# Altium integrated library Altium_Library_Brasil.IntLib: 76 symbols
Pins are listed as number, name and electrical type; pins without a type are passive.

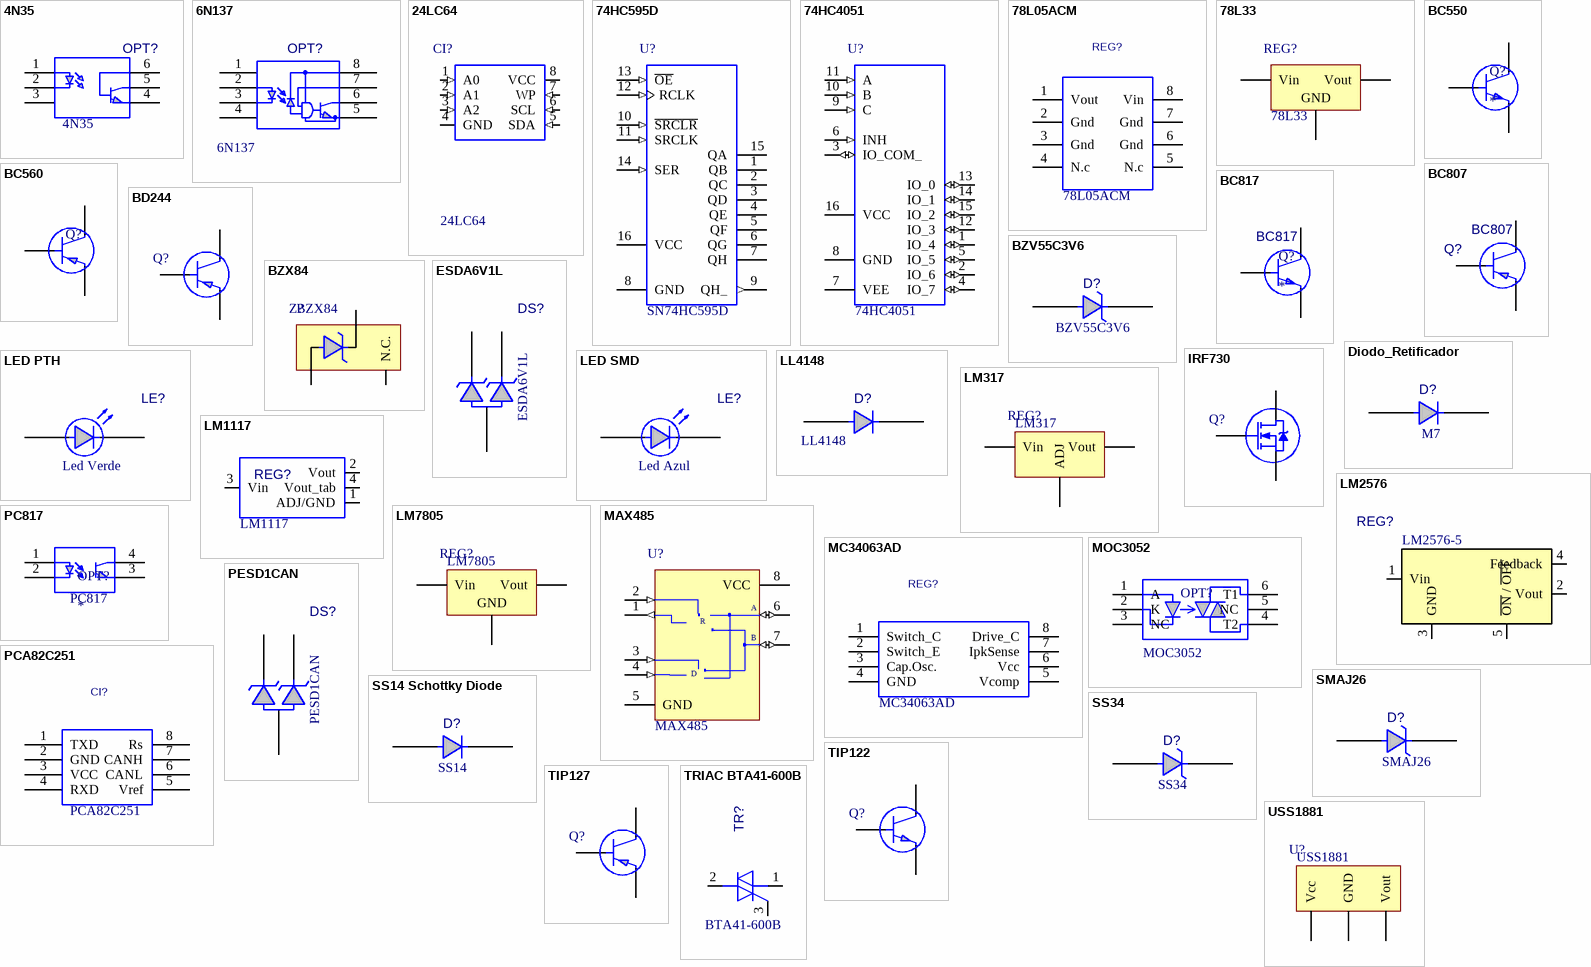
[diagram p0: symbols 4N35 to USS1881]

## 4N35
designator OPT?
Opto Acoplador 4N35; Encapsulamento: DIP 6 - SMD; Valor: *; Marca: *; Observação: *; Descrição: Optoacoplador; Modelo: 4N35
footprint DIP-6 SMD
footprint DIP-6
pins: 1, 2 A, 3 K, 4, 5 GND, 6 OUT

## 6N137
designator OPT?
Encapsulamento: DIP 8 - PTH; Descrição: Optoacoplador de Alta Velocidade; Valor: *; Marca: *; Observação: *; Modelo: 6N137
footprint DIP-8
pins: 1, 2 A, 3 K, 4, 5 GND, 6 OUT, 7 EN, 8 VCC

## 24LC64
designator CI?
Memória EEPROM; Encapsulamento: DIP-8; Observação: Montado sobre Soquete Torneado; Descrição: Memória EEPROM; Valor: *; Modelo: 24LC64
footprint DIP-8
pins: 1 A0 (in), 2 A1 (in), 3 A2 (in), 4 GND (power), 5 SDA (in), 6 SCL (in), 7 WP (in), 8 VCC (power)

## 74HC595D
designator U?  Modelo: SN74HC595D  (hidden comment: 74HC595D)
Descrição: Circuito Integrado 8-bits Shift Register; Encapsulamento: SMD - SOIC 8; Valor: *; Observação: *
footprint SOIC16
pins: 1 QB (hiz), 2 QC (hiz), 3 QD (hiz), 4 QE (hiz), 5 QF (hiz), 6 QG (hiz), 7 QH (hiz), 8 GND (power), 9 QH_ (out), 10 ~{SRCLR} (in), 11 SRCLK (in), 12 RCLK (in), 13 ~{OE} (in), 14 SER (in), 15 QA (hiz), 16 VCC (power)

## 74HC4051
designator U?
Descrição: Circuito Integrado 8 Canais Multiplexador/Demutiplexador; Encapsulamento: SMD - SOIC 8; Valor: *; Observação: *; Modelo: 74HC4051
footprint SOIC16
pins: 1 IO_4 (io), 2 IO_6 (io), 3 IO_COM_ (io), 4 IO_7 (io), 5 IO_5 (io), 6 INH (in), 7 VEE (power), 8 GND (power), 9 C (in), 10 B (in), 11 A (in), 12 IO_3 (io), 13 IO_0 (io), 14 IO_1 (io), 15 IO_2 (io), 16 VCC (power)

## 78L05ACM
designator REG?
Regulador de Tensão 78L05 SOIC; Descrição: Regulador de Tensão 5V; Encapsulamento: SMD SOIC8; Valor: *; Marca: *; Observação: *; Modelo: 78L05ACM
footprint SOIC8
pins: 1 Vout, 2 Gnd, 3 Gnd, 4 N.c, 5 N.c, 6 Gnd, 7 Gnd, 8 Vin

## 78L33
designator REG?
Regulador de Tensão 3V3; Encapsulamento: PTH TO92 ou SOT89; Descrição: Regulador de Tensão 3V3; Valor: *; Marca: *; Observação: *; Modelo: 78L33
footprint TO92
footprint SOT89M (SOT89, 3-Leads, Body 4.5x2.4 mm, Pitch 1.5mm, Lead Span 4.1mm, IPC Low Density)
pins: 1 Vout, 2 GND, 3 Vin

## BC550
designator Q?
Transistor PTH NPN; Encapsulamento: PTH-TO-92; Modelo: BC550; Descrição: Transistor PTH NPN; Valor: *; Marca: *; Observação: *
footprint TO92
pins: 1 C, 2 B, 3 E

## BC560
designator Q?  (value not drawn)
Transistor PTH PNP; Encapsulamento: PTH-TO-92; Modelo: BC550; Descrição: Transistor PTH PNP; Valor: *; Marca: *
footprint TO92
pins: 1 C, 2 B, 3 E

## BC807
designator Q?
Transistor SMD PNP; Encapsulamento: SMD-SOT-23; Descrição: Transistor SMD PNP; Valor: *; Marca: *; Observação: *; Modelo: BC807
footprint SOT23 (Transistor)
pins: 1 B, 2 E, 3 C

## BC817
designator Q?  Modelo: BC817
Transistor SMD NPN; Descrição: Transistor NPN; Encapsulamento: SMD-SOT-23; Valor: *; Marca: *; Observação: *
footprint SOT23 (Transistor)
pins: 1 B, 2 E, 3 C

## BD244
designator Q?  (value not drawn)
Transistor PNP de Média Potência; Encapsulamento: PTH TO-220; Descrição: Transistor PNP de Média Potência; Valor: *; Marca: *; Observação: *
footprint TO-220
footprint TO-220 - 90º
pins: 1 B, 2 C, 3 E

## BZV55C3V6
designator D?
Diodo Zenner 3V6; Encapsulamento: SMD - SOD80C; Descrição: Diodo Zenner 3V6; Valor: *; Marca: *; Observação: *; Modelo: BZV55C3V6
footprint SOD80C MINIMELF
pins: 1, 2

## BZX84
designator Z?, comment Modelo: BZX84  (hidden comment: U18)
Diodo Zenner Regulador de Tensão; Encapsulamento: SMD - SOT23; Marca: NXP; Descrição: Diodo Zenner Regulador de Tensão; Valor: *; Observação: *
footprint SOT23 (Transistor)
pins: 1 A, 2 N.C., 3 K

## Diodo_Retificador
designator D?, comment M7
Diodo Retificador; Encapsulamento: SMD (DO-214AC); Descrição: Diodo Retificador; Observação: *; Valor: *; Modelo: M7
footprint DO214AC
pins: 1 K, 2 A

## ESDA6V1L
designator DS?
Diodo de Proteção ESD; Encapsulamento: SMD SOT23; Descrição: Diodo de Proteção ESD; Observação: *; Valor: *; Modelo: ESDA6V1L
footprint SOT23 (Transistor)
pins: 1 A, 2 K, 3

## IRF730
designator Q?  (value not drawn)
Mosfet Canal N; Descrição: Mosfet de Canal N; Encapsulamento: PTH TO-220; Valor: *; Marca: *; Observação: *; Modelo: *
footprint TO-220
footprint TO-220 - 90º
pins: 1 G, 2 D, 3 S

## LED PTH
designator LE?  Observação: Led Verde  (hidden comment: LED PTH)
Encapsulamento: PTH 3mm; Descrição: Led PTH; Valor: *; Marca: *; Modelo: *
footprint LED PTH 3mm VERDE (LED PTH 3mm)
footprint LED PTH 3mm AMARELO (LED PTH 3mm)
footprint LED PTH 3mm VERMELHO (LED PTH 3mm)
footprint LED PTH 3mm AZUL (LED PTH 3mm)
footprint LED PTH 5mm AMARELO (LED PTH 5mm)
footprint LED PTH 5mm AZUL (LED PTH 5mm)
footprint LED PTH 5mm VERDE (LED PTH 5mm)
footprint LED PTH 5mm VERMELHO (LED PTH 5mm)
pins: 1, 2

## LED SMD
designator LE?  Observação: Led Azul  (hidden comment: LED SMD)
Descrição: Led SMD; Valor: *; Encapsulamento: SMD 0805; Marca: *; Modelo: *
footprint LED 0805 (0805)
footprint LED 1206 (1206)
pins: 1, 2

## LL4148
designator D?
Diodo LL4148 Melf; Descrição: Diodo SMD LL4148; Encapsulamento: SMD MiniMelf; Valor: *; Marca: *; Observação: *; Modelo: LL4148
footprint SOD80C MINIMELF
pins: 1, 2

## LM317
designator REG?
Regulador de Tensão 5V; Descrição: Regulador de Tensão Variavel; Encapsulamento: PTH TO-220; Valor: *; Marca: *; Observação: *; Modelo: LM317
footprint TO-220
footprint TO-220 - 90º
pins: 1 ADJ, 2 Vout, 3 Vin

## LM1117
designator REG?
Regulador de Tensão LM1117; Encapsulamento: SOT223; Descrição: Regulador de Tensão; Valor: *; Marca: *; Observação: *; Modelo: LM1117
footprint SOT223 (LM1117 SOT223, 4-Leads, Body 6.5x3.5mm, Pitch 2.3mm, Lead Span 7mm, IPC Low Density)
pins: 1 ADJ/GND, 2 Vout, 3 Vin, 4 Vout_tab

## LM2576
designator REG?  Modelo: LM2576-5  (hidden comment: LM2576)
Regulador de Tensão LM2576; Encapsulamento: SMD SOT-263-5; Descrição: Regulador de Tensão; Valor: *; Marca: *; Observação: *
footprint TO-263-5 (D2-PAK, 6-Pads, Body 8,9x9,9mm (max), IPC Low Density)
footprint TO-220 - 5
footprint TO-220 - 5 - 90º
pins: 1 Vin, 2 Vout, 3 GND, 4 Feedback, 5 ~{ON} / ~{OFF}

## LM7805
designator REG?
Regulador de Tensão 5V; Descrição: Regulador de Tensão 3V3; Encapsulamento: PTH TO-220; Valor: *; Marca: *; Observação: *; Modelo: LM7805
footprint TO-220
footprint TO-220 - 90º
pins: 1 Vin, 2 GND, 3 Vout

## MAX485
designator U?
Descrição: Transiver Max485; Encapsulamento: DIP-8; Marca: Maxim; Valor: *; Observação: *; Modelo: MAX485
footprint DIP-8
footprint SOIC8
pins: 1 RO (out), 2 ~{RE} (in), 3 DE (in), 4 DI (in), 5 GND (power), 6 A (io), 7 B (io), 8 VCC (power)
text: R; D

## MC34063AD
designator REG?
Regulador de Tensão Variavel; Encapsulamento: SMD SOIC8; Descrição: Regulador de Tensão Variavel; Valor: *; Marca: *; Observação: *; Modelo: MC34063AD
footprint SOIC8
pins: 1 Switch_C, 2 Switch_E, 3 Cap.Osc., 4 GND, 5 Vcomp, 6 Vcc, 7 IpkSense, 8 Drive_C

## MOC3052
designator OPT?  Modelo: MOC3052  (hidden comment: *)
OptoAcoplador MOC3052; Descrição: OptoAcoplador Driver Triac; Encapsulamento: PTH-TO-92; Valor: *; Marca: *; Observação: *
footprint DIP-6 SMD
footprint DIP-6
pins: 1 A, 2 K, 3 NC, 4 T2, 5 NC, 6 T1

## PC817
designator OPT?  Modelo: PC817
OptoAcoplador 4 terminais; Encapsulamento: SMD; Descrição: OptoAcoplador 4 Terminais; Valor: *; Marca: *; Observação: *
footprint DIP-4
footprint DIP-4 SMD
pins: 1 A, 2 K, 3 EMISSOR, 4 COLETOR

## PCA82C251
designator CI?
Driver de CAN; Descrição: Driver de Rede CAN; Encapsulamento: SMD SOIC8; Marca: NXP; Valor: *; Observação: *; Modelo: PCA82C251
footprint SOIC8
pins: 1 TXD, 2 GND, 3 VCC, 4 RXD, 5 Vref, 6 CANL, 7 CANH, 8 Rs

## PESD1CAN
designator DS?
Diodo de Proteção ESD de Rede CAN; Encapsulamento: SMD SOT23; Descrição: Diodo de Proteção ESD de Rede CAN; Observação: *; Valor: *; Modelo: PESD1CAN
footprint SOT23 (Transistor)
pins: 1 A, 2 K, 3

## SMAJ26
designator D?
DIODO-SCHOTTKY-SMD 3A 40V; Descrição: Diodo Supressor de Tensão Transiente; Encapsulamento: SMD - DO214AB; Valor: *; Marca: *; Observação: *; Modelo: SMAJ26
footprint DO214AC
pins: 1, 2

## SS14 Schottky Diode
designator D?, comment Modelo: SS14  (hidden comment: DIODO_SS14_S1D)
Diodo SMD Shottky; Descrição: Diodo Schottky Retificador; Encapsulamento: SMD (DO-214AC); Marca: Vishay; Observação: *
footprint DO214AC
pins: 1 K, 2 A

## SS34
designator D?
DIODO-SCHOTTKY-SMD 3A 40V; Descrição: Diodo Schottky 3A 40V; Encapsulamento: SMD - DO214AB; Valor: *; Marca: *; Observação: *; Modelo: SS34
footprint DO214AB (Diodo SMD package SMC - DO214AB)
pins: 1, 2

## TIP122
designator Q?  (value not drawn)
Transistor NPN de Média Potência; Encapsulamento: PTH TO-220; Descrição: Transistor NPN de Média Potência; Valor: *; Marca: *; Observação: *; Modelo: *
footprint TO-220
footprint TO-220 - 90º
pins: 1 B, 2 C, 3 E

## TIP127
designator Q?  (value not drawn)
Transistor PNP de Média Potência; Encapsulamento: PTH TO-220; Descrição: Transistor PNP de Média Potência; Valor: *; Marca: *; Observação: *; Modelo: *
footprint TO-220
footprint TO-220 - 90º
pins: 1 B, 2 C, 3 E

## TRIAC BTA41-600B
designator TR?  Modelo: BTA41-600B  (hidden comment: TRIAC BTA41-600B)
TRIAC_TOP3_BTA; Descrição: TRIAC 40 A; Encapsulamento: PTH - BTA41; Valor: *; Marca: *; Observação: *
footprint BTA41
pins: 1 M1, 2 M2, 3 G

## USS1881
designator U?
Sensor de Efeito Hall; Encapsulamento: PTH - SIP3; Descrição: Sensor de Efeito Hall; Valor: *; Marca: *; Observação: *; Modelo: USS1881
footprint SIP-3
pins: 1 Vcc, 2 GND, 3 Vout


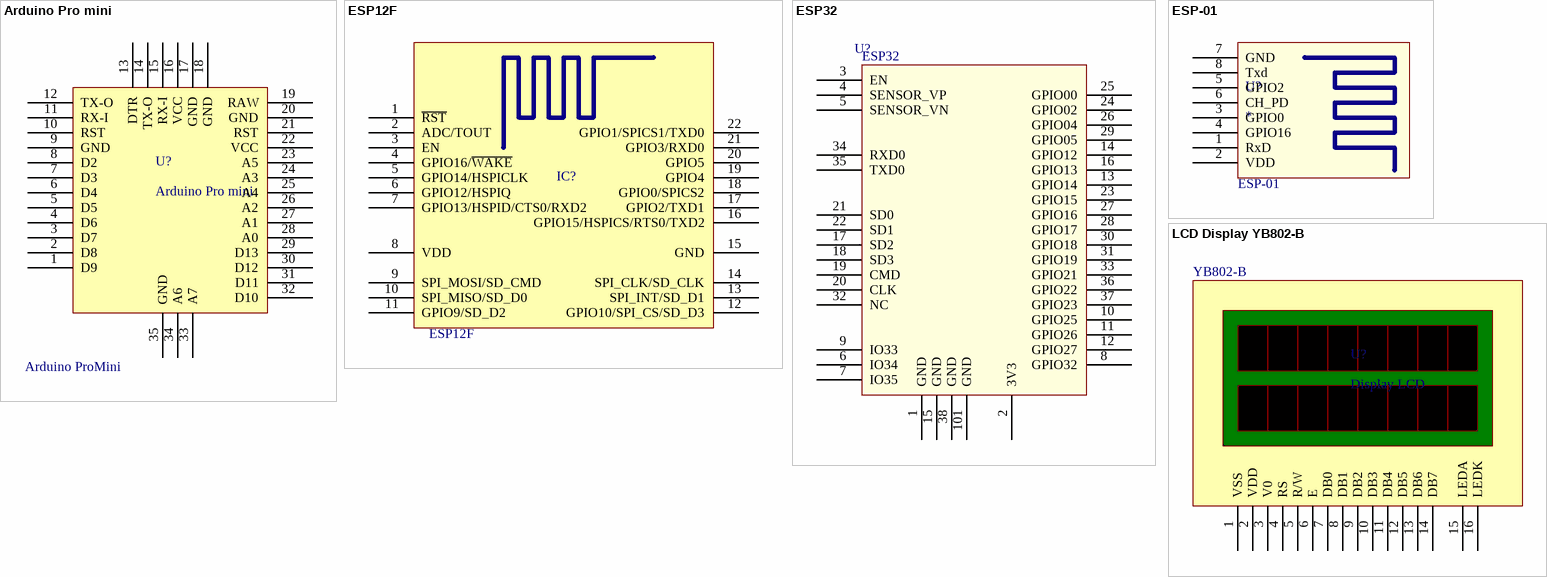
[diagram p1: symbols Arduino Pro mini to LCD Display YB802-B]

## Arduino Pro mini
designator U?  Modelo: Arduino ProMini
Descrição: Modulo Arduino ProMini; Valor: *; Encapsulamento: *; Marca: *; Observação: *
footprint Arduino Pro Mini
pins: 1 D9, 2 D8, 3 D7, 4 D6, 5 D5, 6 D4, 7 D3, 8 D2, 9 GND, 10 RST, 11 RX-I, 12 TX-O, 13 DTR, 14 TX-O, 15 RX-I, 16 VCC, 17 GND, 18 GND, 19 RAW, 20 GND, 21 RST, 22 VCC, 23 A5, 24 A3, 25 A4, 26 A2, 27 A1, 28 A0, 29 D13, 30 D12, 31 D11, 32 D10, 33 A7, 34 A6, 35 GND

## ESP12F
designator IC?
ESP8266 ESP-12-E; Descrição: Modulo ESP12F; Encapsulamento: SMD; Marca: Espressif; Observação: Modulo com Microcontrolador ESP8266; Valor: *; Modelo: ESP12F
footprint ESP8266 ESP-12-F - SMD (ESP8266 ESP-12-E)
pins: 1 ~{RST} "Reset", 2 ADC/TOUT "ADC Input Or TOUT Output", 3 EN "Chip enable", 4 GPIO16/~{WAKE} "GPIO16 or Deep-Sleep Wakeup", 5 GPIO14/HSPICLK "GPIO14 or SPI CLK", 6 GPIO12/HSPIQ "GPIO12 or SPIQ", 7 GPIO13/HSPID/CTS0/RXD2 "GPIO13 or SPID", 8 VDD "Power supply", 9 SPI_MOSI/SD_CMD "GPIO14 or SPI CLK", 10 SPI_MISO/SD_D0 "GPIO12 or SPIQ", 11 GPIO9/SD_D2 "GPIO13 or SPID", 12 GPIO10/SPI_CS/SD_D3 "GPIO15 or SPICS", 13 SPI_INT/SD_D1 "GPIO2 or TX", 14 SPI_CLK/SD_CLK "GPIO0 or SPICS2", 15 GND "Power ground", 16 GPIO15/HSPICS/RTS0/TXD2 "GPIO15 or SPICS", 17 GPIO2/TXD1 "GPIO2 or TX", 18 GPIO0/SPICS2 "GPIO0 or SPICS2", 19 GPIO4 "GPIO5", 20 GPIO5 "GPIO4", 21 GPIO3/RXD0 "GPIO3 or UART RXD", 22 GPIO1/SPICS1/TXD0 "GPIO1 or UART TXD"

## ESP32
designator U?  Modelo: ESP32  (hidden comment: *)
Modulo Wifi ESP32; Encapsulamento: SMD; Marca: Espressif; Descrição: Modulo WiFi; Valor: *; Observação: *
footprint ESP32S_W (Esp32S Module wide for hand soldering)
pins: 1 GND (power), 2 3V3 (power), 3 EN (power), 4 SENSOR_VP, 5 SENSOR_VN, 6 IO34, 7 IO35, 8 GPIO32, 9 IO33, 10 GPIO25, 11 GPIO26, 12 GPIO27, 13 GPIO14, 14 GPIO12, 15 GND (power), 16 GPIO13, 17 SD2, 18 SD3, 19 CMD, 20 CLK, 21 SD0, 22 SD1, 23 GPIO15, 24 GPIO02, 25 GPIO00, 26 GPIO04, 27 GPIO16, 28 GPIO17, 29 GPIO05, 30 GPIO18, 31 GPIO19, 32 NC, 33 GPIO21, 34 RXD0, 35 TXD0, 36 GPIO22, 37 GPIO23, 38 GND (power), 101 GND (power)

## ESP-01
designator U?  Modelo: ESP-01
Modulo Wi-Fi ESP01; Descrição: Modulo ESP-01; Encapsulamento: PTH; Valor: *; Marca: *; Observação: *
footprint ESP8266 ESP-01
pins: 1 RxD, 2 VDD, 3 GPIO0, 4 GPIO16, 5 GPIO2, 6 CH_PD, 7 GND, 8 Txd

## LCD Display YB802-B
designator U?, comment Display LCD  Modelo: YB802-B
Descrição: Display LCD 8x2; Encapsulamento: PTH; Valor: *; Marca: *; Observação: *
footprint DISPLAY LCD YB802-B
pins: 1 VSS, 2 VDD, 3 V0, 4 RS, 5 R/W, 6 E, 7 DB0, 8 DB1, 9 DB2, 10 DB3, 11 DB4, 12 DB5, 13 DB6, 14 DB7, 15 LEDA, 16 LEDK


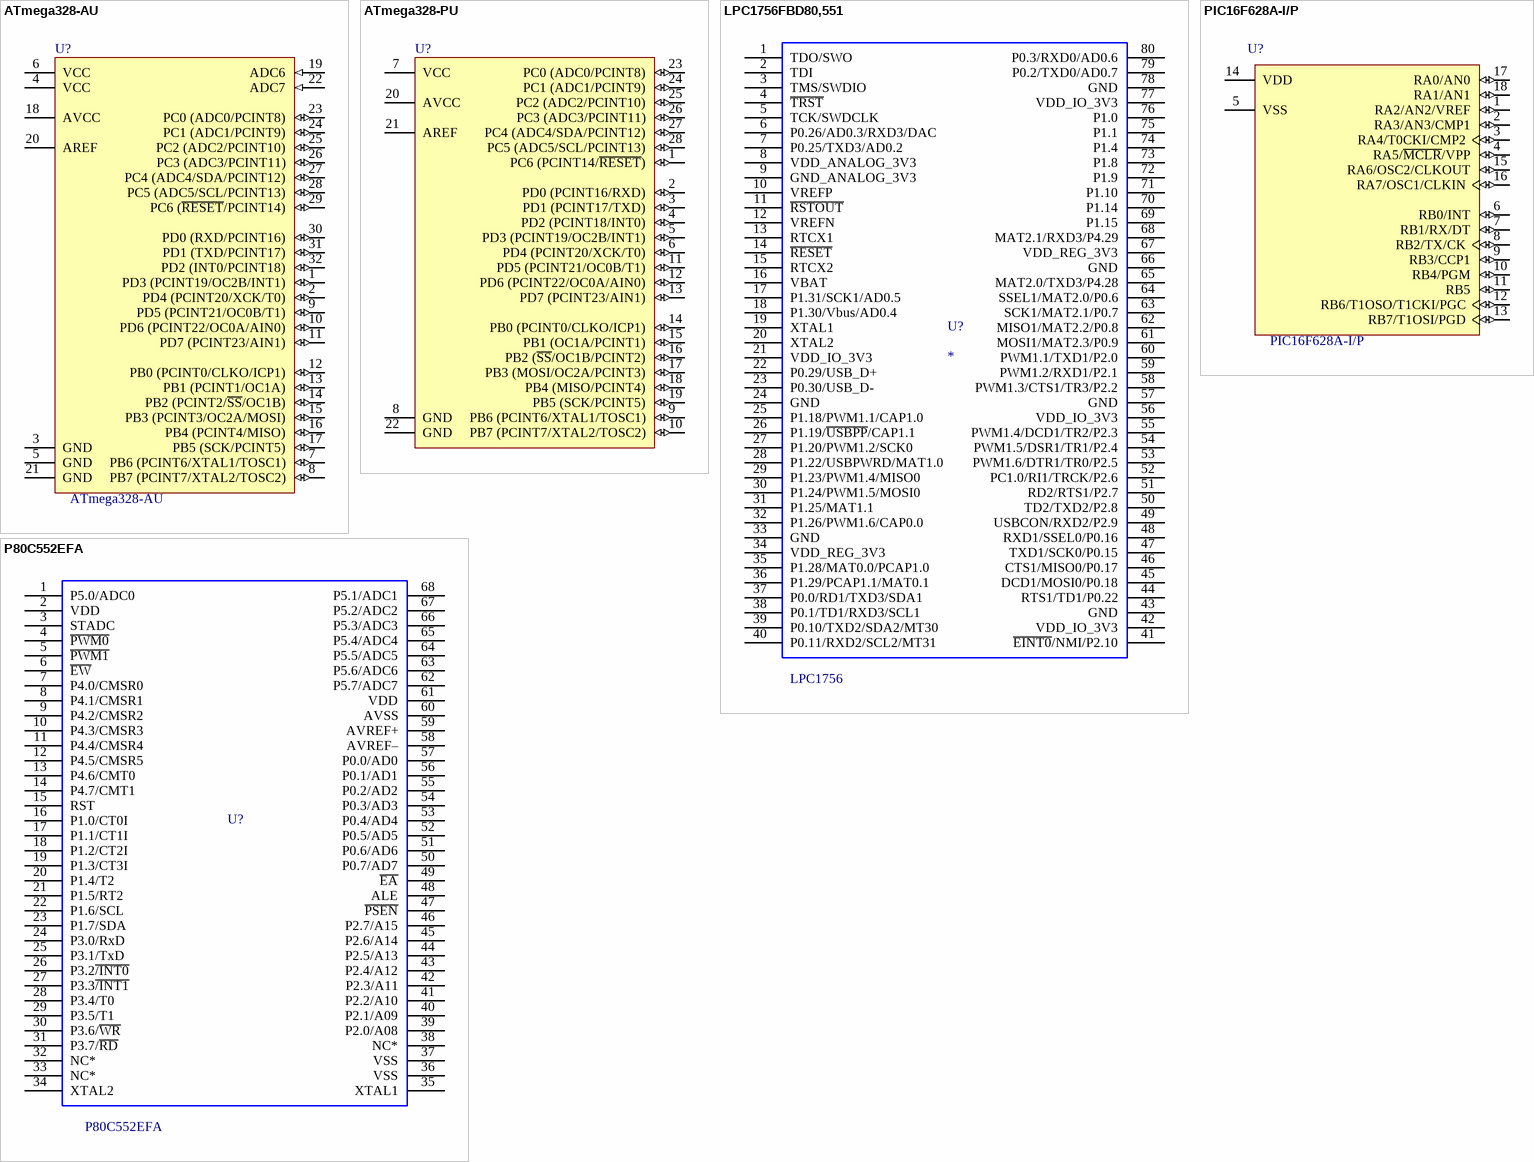
[diagram p2: symbols ATmega328-AU to PIC16F628A-I/P]

## ATmega328-AU
designator U?  Modelo: ATmega328-AU
8-bit AVR Microcontroller, 32KB Flash, 1KB EEPROM, 2KB SRAM, 32-pin TQFP, Industrial Grade (-40°C to 85°C); Descrição: Microcontrolador 8 Bits; Encapsulamento: SMD 32A; Marca: Atmel; Valor: *; Observação: *
footprint TQFP32 (Thin QFP, 32-Leads, Body 7x7mm, Pitch 0.8mm, IPC Medium Density)
pins: 1 PD3 (PCINT19/OC2B/INT1) (io), 2 PD4 (PCINT20/XCK/T0) (io), 3 GND (power), 4 VCC (power), 5 GND (power), 6 VCC (power), 7 PB6 (PCINT6/XTAL1/TOSC1) (io), 8 PB7 (PCINT7/XTAL2/TOSC2) (io), 9 PD5 (PCINT21/OC0B/T1) (io), 10 PD6 (PCINT22/OC0A/AIN0) (io), 11 PD7 (PCINT23/AIN1) (io), 12 PB0 (PCINT0/CLKO/ICP1) (io), 13 PB1 (PCINT1/OC1A) (io), 14 PB2 (PCINT2/~{SS}/OC1B) (io), 15 PB3 (PCINT3/OC2A/MOSI) (io), 16 PB4 (PCINT4/MISO) (io), 17 PB5 (SCK/PCINT5) (io), 18 AVCC (power), 19 ADC6 (in), 20 AREF, 21 GND (power), 22 ADC7 (in), 23 PC0 (ADC0/PCINT8) (io), 24 PC1 (ADC1/PCINT9) (io), 25 PC2 (ADC2/PCINT10) (io), 26 PC3 (ADC3/PCINT11) (io), 27 PC4 (ADC4/SDA/PCINT12) (io), 28 PC5 (ADC5/SCL/PCINT13) (io), 29 PC6 (~{RESET}/PCINT14) (io), 30 PD0 (RXD/PCINT16) (io), 31 PD1 (TXD/PCINT17) (io), 32 PD2 (INT0/PCINT18) (io)

## ATmega328-PU
designator U?
8-bit AVR Microcontroller, 32KB Flash, 1KB EEPROM, 2KB SRAM, 28-pin PDIP, Industrial Grade (-40°C to 85°C); Descrição: Microcontrolador ATmega328; Encapsulamento: PTH DIP28; Marca: ATmel; Modelo: ATmega328-PU; Valor: *; Observação: *
footprint DIP28 (DIP, 28-Leads, Row Spacing 7.62mm, Pitch 2.54mm, Body 34.67x7.3mm)
pins: 1 PC6 (PCINT14/~{RESET}) (io), 2 PD0 (PCINT16/RXD) (io), 3 PD1 (PCINT17/TXD) (io), 4 PD2 (PCINT18/INT0) (io), 5 PD3 (PCINT19/OC2B/INT1) (io), 6 PD4 (PCINT20/XCK/T0) (io), 7 VCC (power), 8 GND (power), 9 PB6 (PCINT6/XTAL1/TOSC1) (io), 10 PB7 (PCINT7/XTAL2/TOSC2) (io), 11 PD5 (PCINT21/OC0B/T1) (io), 12 PD6 (PCINT22/OC0A/AIN0) (io), 13 PD7 (PCINT23/AIN1) (io), 14 PB0 (PCINT0/CLKO/ICP1) (io), 15 PB1 (OC1A/PCINT1) (io), 16 PB2 (~{SS}/OC1B/PCINT2) (io), 17 PB3 (MOSI/OC2A/PCINT3) (io), 18 PB4 (MISO/PCINT4) (io), 19 PB5 (SCK/PCINT5) (io), 20 AVCC (power), 21 AREF (power), 22 GND (power), 23 PC0 (ADC0/PCINT8) (io), 24 PC1 (ADC1/PCINT9) (io), 25 PC2 (ADC2/PCINT10) (io), 26 PC3 (ADC3/PCINT11) (io), 27 PC4 (ADC4/SDA/PCINT12) (io), 28 PC5 (ADC5/SCL/PCINT13) (io)

## LPC1756FBD80,551
designator U?  Valor: LPC1756
Microcontrolador ARM Cortex M3; Descrição: Microntrolador ARM Cortex M3; Encapsulamento: SMD-LQFP80; Marca: NXP; Modelo: LPC1756FBD80,551; Observação: *
footprint QFP80Pins
pins: 1 TDO/SWO, 2 TDI, 3 TMS/SWDIO, 4 ~{TRST}, 5 TCK/SWDCLK, 6 P0.26/AD0.3/RXD3/DAC, 7 P0.25/TXD3/AD0.2, 8 VDD_ANALOG_3V3, 9 GND_ANALOG_3V3, 10 VREFP, 11 ~{RSTOUT}, 12 VREFN, 13 RTCX1, 14 ~{RESET}, 15 RTCX2, 16 VBAT, 17 P1.31/SCK1/AD0.5, 18 P1.30/Vbus/AD0.4, 19 XTAL1, 20 XTAL2, 21 VDD_IO_3V3, 22 P0.29/USB_D+, 23 P0.30/USB_D-, 24 GND, 25 P1.18/PWM1.1/CAP1.0, 26 P1.19/~{USBPP}/CAP1.1, 27 P1.20/PWM1.2/SCK0, 28 P1.22/USBPWRD/MAT1.0, 29 P1.23/PWM1.4/MISO0, 30 P1.24/PWM1.5/MOSI0, 31 P1.25/MAT1.1, 32 P1.26/PWM1.6/CAP0.0, 33 GND, 34 VDD_REG_3V3, 35 P1.28/MAT0.0/PCAP1.0, 36 P1.29/PCAP1.1/MAT0.1, 37 P0.0/RD1/TXD3/SDA1, 38 P0.1/TD1/RXD3/SCL1, 39 P0.10/TXD2/SDA2/MT30, 40 P0.11/RXD2/SCL2/MT31, 41 ~{EINT0}/NMI/P2.10, 42 VDD_IO_3V3, 43 GND, 44 RTS1/TD1/P0.22, 45 DCD1/MOSI0/P0.18, 46 CTS1/MISO0/P0.17, 47 TXD1/SCK0/P0.15, 48 RXD1/SSEL0/P0.16, 49 USBCON/RXD2/P2.9, 50 TD2/TXD2/P2.8, 51 RD2/RTS1/P2.7, 52 PC1.0/RI1/TRCK/P2.6, 53 PWM1.6/DTR1/TR0/P2.5, 54 PWM1.5/DSR1/TR1/P2.4, 55 PWM1.4/DCD1/TR2/P2.3, 56 VDD_IO_3V3, 57 GND, 58 PWM1.3/CTS1/TR3/P2.2, 59 PWM1.2/RXD1/P2.1, 60 PWM1.1/TXD1/P2.0, 61 MOSI1/MAT2.3/P0.9, 62 MISO1/MAT2.2/P0.8, 63 SCK1/MAT2.1/P0.7, 64 SSEL1/MAT2.0/P0.6, 65 MAT2.0/TXD3/P4.28, 66 GND, 67 VDD_REG_3V3, 68 MAT2.1/RXD3/P4.29, 69 P1.15, 70 P1.14, 71 P1.10, 72 P1.9, 73 P1.8, 74 P1.4, 75 P1.1, 76 P1.0, 77 VDD_IO_3V3, 78 GND, 79 P0.2/TXD0/AD0.7, 80 P0.3/RXD0/AD0.6

## P80C552EFA
designator U?  Valor: P80C552EFA  (hidden comment: *)
Microcontrolador 8 bits; Descrição: Microntrolador 8 bits; Encapsulamento: SMD-PLCC68; Marca: NXP; Modelo: P80C552EFA; Observação: *
pins: 1 P5.0/ADC0, 2 VDD, 3 STADC, 4 ~{PWM0}, 5 ~{PWM1}, 6 ~{EW}, 7 P4.0/CMSR0, 8 P4.1/CMSR1, 9 P4.2/CMSR2, 10 P4.3/CMSR3, 11 P4.4/CMSR4, 12 P4.5/CMSR5, 13 P4.6/CMT0, 14 P4.7/CMT1, 15 RST, 16 P1.0/CT0I , 17 P1.1/CT1I, 18 P1.2/CT2I, 19 P1.3/CT3I, 20 P1.4/T2, 21 P1.5/RT2, 22 P1.6/SCL, 23 P1.7/SDA, 24 P3.0/RxD, 25 P3.1/TxD, 26 P3.2~{/INT0}, 27 P3.3~{/INT1}, 28 P3.4/T0, 29 P3.5/T1, 30 P3.6/~{WR}, 31 P3.7/~{RD}, 32 NC*, 33 NC*, 34 XTAL2, 35 XTAL1, 36 VSS, 37 VSS, 38 NC*, 39 P2.0/A08, 40 P2.1/A09, 41 P2.2/A10, 42 P2.3/A11, 43 P2.4/A12, 44 P2.5/A13, 45 P2.6/A14, 46 P2.7/A15, 47 ~{PSEN}, 48 ALE, 49 ~{EA}, 50 P0.7/AD7, 51 P0.6/AD6, 52 P0.5/AD5, 53 P0.4/AD4, 54 P0.3/AD3, 55 P0.2/AD2, 56 P0.1/AD1, 57 P0.0/AD0, 58 AVREF–, 59 AVREF+, 60 AVSS, 61 VDD, 62 P5.7/ADC7, 63 P5.6/ADC6, 64 P5.5/ADC5, 65 P5.4/ADC4, 66 P5.3/ADC3, 67 P5.2/ADC2, 68 P5.1/ADC1

## PIC16F628A-I/P
designator U?
FLASH-Based 8-Bit CMOS Microcontroller with nanoWatt Technology, 2K (x14-Bit words) FLASH, 224 Bytes SRAM, 18-Pin PDIP, 3.0 to 5.5V Supply Range, Industrial Temperature; Descrição: Microcontrolador 8 bits; Encapsulamento: PTH - DIP18; Marca: Microchip; Valor: *; Observação: *; Modelo: PIC16F628A-I/P
footprint DIP18 (DIP, 18-Leads, Row Spacing 7.62mm, Pitch 2.54mm, Body 22.9x6.6mm)
pins: 1 RA2/AN2/VREF (io), 2 RA3/AN3/CMP1 (io), 3 RA4/T0CKI/CMP2 (io), 4 RA5/~{MCLR}/VPP (io), 5 VSS (power), 6 RB0/INT (io), 7 RB1/RX/DT (io), 8 RB2/TX/CK (io), 9 RB3/CCP1 (io), 10 RB4/PGM (io), 11 RB5 (io), 12 RB6/T1OSO/T1CKI/PGC (io), 13 RB7/T1OSI/PGD (io), 14 VDD (power), 15 RA6/OSC2/CLKOUT (io), 16 RA7/OSC1/CLKIN (io), 17 RA0/AN0 (io), 18 RA1/AN1 (io)


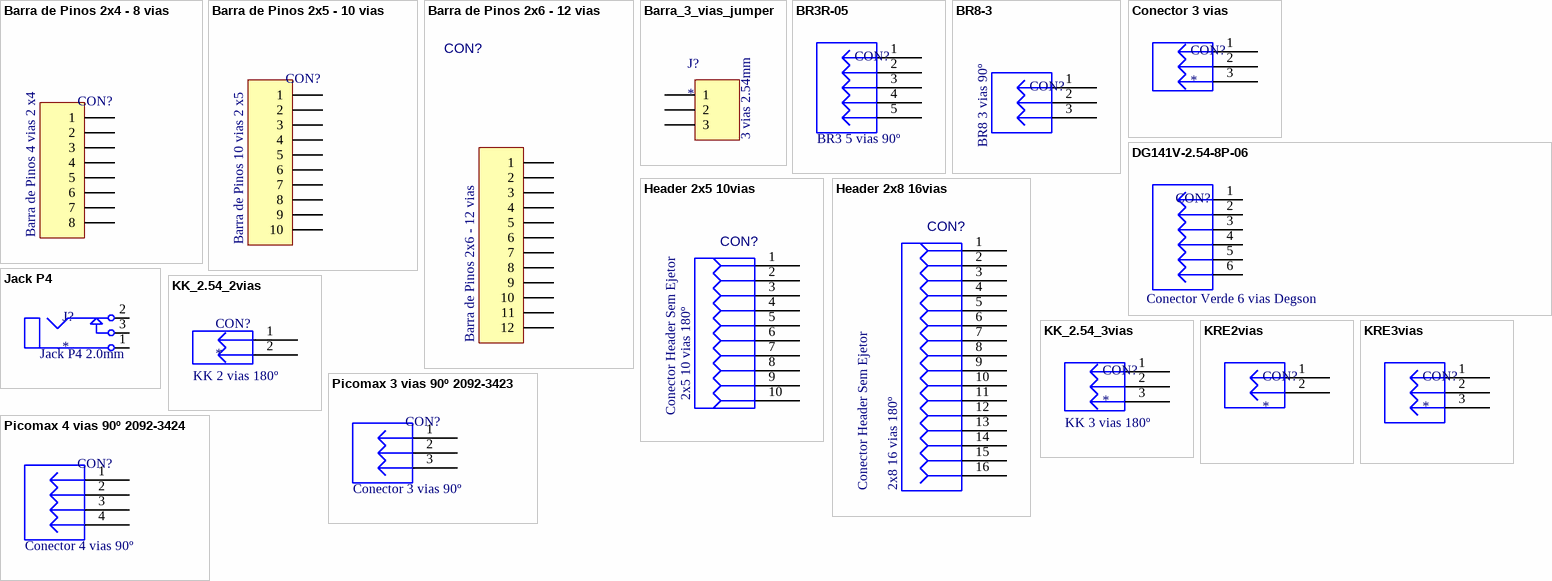
[diagram p3: symbols Barra de Pinos 2x4 - 8 vias to Picomax 4 vias 90º 2092-3424]

## Barra de Pinos 2x4 - 8 vias
designator CON?  Descrição: Barra de Pinos 4 vias 2 x4  (hidden comment: *)
Barra de Pinos 8 vias 2x4; Modelo: 2x4 8 vias - 180º; Observação: Não Montar; Encapsulamento: PTH - 180º; Marca: *
footprint HDR2X4 (Connector; Header; 3x2 Position)
footprint BARRA DE PINOS 2X4 - 90°
pins: 1, 2, 3, 4, 5, 6, 7, 8

## Barra de Pinos 2x5 - 10 vias
designator CON?  Descrição: Barra de Pinos 10 vias 2 x5  (hidden comment: *)
Barra de Pinos 10 vias 2x5; Modelo: 2x5 10 vias - 180º; Observação: Não Montar; Encapsulamento: PTH - 180º; Marca: *
footprint BARRA DE PINOS 2x5 180º (BARRA DE PINOS 5x2 180º Position)
pins: 1, 2, 3, 4, 5, 6, 7, 8, 9, 10

## Barra de Pinos 2x6 - 12 vias
designator CON?
Encapsulamento: PTH - 12 vias 180º; Marca: *; Modelo: *; Observação: *; Valor: *; Descrição: Barra de Pinos 2x6 - 12 vias
footprint BARRA DE PINOS 2X6 - 90°
footprint BARRA DE PINOS 2x6 180º (BARRA DE PINOS 2x6 180º Position)
pins: 1, 2, 3, 4, 5, 6, 7, 8, 9, 10, 11, 12

## Barra_3_vias_jumper
designator J?  Valor: 3 vias 2.54mm
Barra de Pinos 3 vias com Jumper; Descrição: Barras de Pinos 3 vias 180º com Jumper; Encapsulamento: PTH - 3 Vias 180º; Modelo: 3 Vias 180º; Marca: *; Observação: *
footprint Barra_Pinos_3_Jumper
pins: 1, 2, 3

## BR3R-05
designator CON?  Valor: BR3 5 vias 90º  (hidden comment: *)
Conector BR3 5 vias; Descrição: Conector BR3 5 vias 90º; Encapsulamento: PTH - 90º; Marca: Metaltex; Modelo: 5 vias - 90º; Observação: *
footprint KR3R-5vias
pins: 1, 2, 3, 4, 5

## BR8-3
designator CON?  Valor: BR8 3 vias 90º  (hidden comment: *)
Conector BR3 5 vias; Descrição: Conector BR8 3 vias; Encapsulamento: PTH - 90º; Marca: Metaltex; Modelo: BR8MN-03; Observação: *
footprint BR8MC-03
footprint BR8MN-03
pins: 1, 2, 3

## Conector 3 vias
designator CON?
Conector 3 vias sem corpo; Encapsulamento: PTH - 180º; Modelo: 3 vias - 180º; Descrição: Conector 3 vias sem Corpo; Marca: *; Observação: *
footprint CONECTOR_3_VIAS_SEM_CORPO
pins: 1, 2, 3

## DG141V-2.54-8P-06
designator CON?  Descrição: Conector Verde 6 vias Degson  (hidden comment: *)
Degson 6 Vias Verde; Encapsulamento: PTH - 180º; Modelo: DG141V-2.54-8P-06; Marca: *; Observação: *
footprint DG141V-2.54-8P-06
pins: 1, 2, 3, 4, 5, 6

## Header 2x5 10vias
designator CON?  Modelo: 2x5 10 vias 180º  Descrição: Conector Header Sem Ejetor  (hidden comment: Header 2x5 10vias)
CONNFEM2X5; Encapsulamento: PTH - 2x5 10 vias 180º; Valor: *; Marca: *; Observação: *
footprint HEADER 2x5 180º
footprint HEADER 2x5 90º
pins: 1, 2, 3, 4, 5, 6, 7, 8, 9, 10

## Header 2x8 16vias
designator CON?  Modelo: 2x8 16 vias 180º  Descrição: Conector Header Sem Ejetor  (hidden comment: Header 2x8 16vias)
CONNFEM2X5; Encapsulamento: PTH - 2x8 16 vias 180º; Valor: *; Marca: *; Observação: *
footprint HEADER 2x8 180º
footprint HEADER 2x8 180º SMD
pins: 1, 2, 3, 4, 5, 6, 7, 8, 9, 10, 11, 12, 13, 14, 15, 16

## Jack P4
designator J?  Valor: Jack P4 2.0mm
Conector Femêa Jack P4; Descrição: Conector Femêa Jack P4 2mm; Encapsulamento: PTH; Marca: *; Modelo: *; Observação: *
footprint CONECTOR_JACK_P4
pins: 1, 2, 3

## KK_2.54_2vias
designator CON?  Valor: KK 2 vias 180º
Conector KK 2.54mm 2 vias; Descrição: Conector KK 3 vias com passo 2.54mm; Encapsulamento: PTH - 180º; Modelo: 2 vias - 180º; Marca: *; Observação: *
footprint KK_2VIAS_180º
pins: 1, 2

## KK_2.54_3vias
designator CON?  Valor: KK 3 vias 180º
Conector KK 2.54mm 3 vias; Descrição: Conector KK 3 vias com passo 2.54mm; Encapsulamento: PTH - 180º; Modelo: 3 vias - 180º; Marca: *; Observação: *
footprint KK_3vias_180º
pins: 1, 2, 3

## KRE2vias
designator CON?
Conector 2 vias; Descrição: Conector KRE 2 vias 180º; Encapsulamento: PTH - 180º; Modelo: 2 vias - 180º; Marca: *; Observação: *
footprint KRE2-2vias
pins: 1, 2

## KRE3vias
designator CON?
Conector 3 vias; Descrição: Conector KRE 3 vias 180º; Encapsulamento: PTH - 180º; Modelo: 3 vias - 180º; Marca: *; Observação: *
footprint KRE3-3vias
pins: 1, 2, 3

## Picomax 3 vias 90º 2092-3423
designator CON?  Descrição: Conector 3 vias 90º  (hidden comment: *)
WAGO 2092-3423; Encapsulamento: PTH - 3 vias 90º; Marca: WAGO; Modelo: 2092-3423
footprint Conn PicoMax 2092-3423
pins: 1, 2, 3

## Picomax 4 vias 90º 2092-3424
designator CON?  Descrição: Conector 4 vias 90º  (hidden comment: *)
WAGO 2092-3424; Encapsulamento: PTH - 4 vias 90º; Marca: WAGO; Modelo: 2092-3424
footprint Conn PicoMax 2092-3424
pins: 1, 2, 3, 4


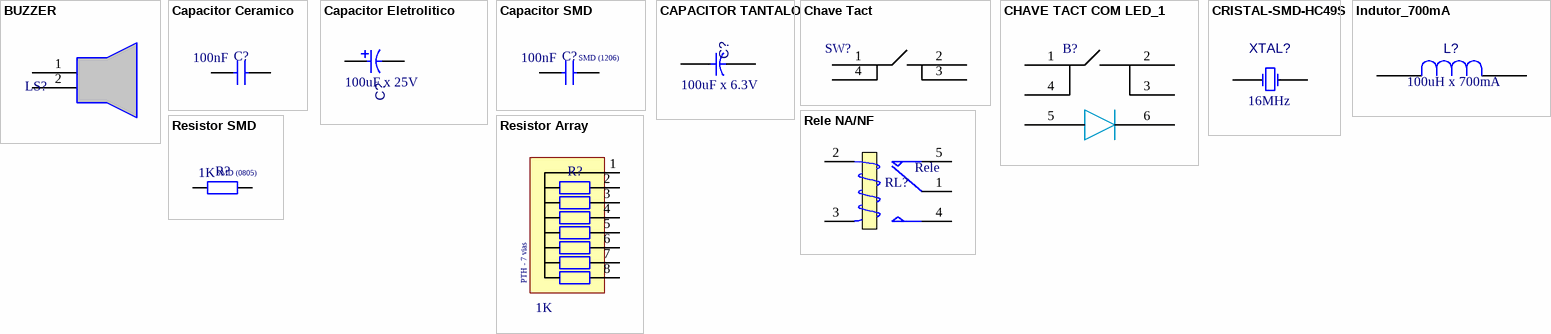
[diagram p4: symbols BUZZER to Resistor SMD]

## BUZZER
designator LS?  (value not drawn)
DC Buzzer; Descrição: BUZZER 5V; Encapsulamento: PTH; Marca: *; Modelo: *; Observação: *
footprint Buzzer
pins: 1, 2

## Capacitor Ceramico
designator C?  Valor: 100nF  (hidden comment: *)
Capacitor PTH; Descrição: Capacitor Ceramico; Marca: *; Modelo: *; Observação: *; Encapsulamento: PTH
footprint Capacitor Ceramico
footprint CAPACITOR CERAMICO-GORDO
pins: 1, 2

## Capacitor Eletrolitico
designator C?  Valor: 100uF x 25V  (hidden comment: Capacitor Eletrolitico)
Descrição: Capacitor Eletrolitico PTH; Encapsulamento: PTH Radia Xmm x Ymm; Marca: *; Modelo: *; Observação: *
footprint CAPACITOR ELETROLITICO 5x11x2.54mm (Radial Capacitor 5x11x2.54mm)
footprint CAPACITOR ELETROLITICO 4x5x1.6mm (Radial Capacitor 4x5x1.5mm)
footprint CAPACITOR ELETROLITICO 6,3x11x2.54mm (Radial Capacitor 6,35x11x2.54mm)
footprint CAPACITOR ELETROLITICO 8x11x3.5mm (Radial Capacitor 8x11x3.5mm)
footprint CAPACITOR ELETROLITICO 10x12.5x5.08mm (Radial Capacitor 10x12x5.08mm)
footprint CAPACITOR ELETROLITICO 10x16x5.08mm (Radial Capacitor 10x16x5.08mm)
footprint CAPACITOR ELETROLITICO 10x20x5.08mm (Radial Capacitor 10x20x5.08mm)
footprint CAPACITOR ELETROLITICO 12.5x20x5.08mm (Radial Capacitor 12.5x20x5.08mm)
footprint CAPACITOR ELETROLITICO 12.5x25x5.08mm (Radial Capacitor 12.5x25x5.08mm)
footprint CAPACITOR ELETROLITICO 16x25x7.62mm (Radial Capacitor 16x25x7.62mm)
footprint CAPACITOR ELETROLITICO 16x31.5x7.62mm - duplicate (Radial Capacitor 16x31.5x7.62mm)
footprint CAPACITOR ELETROLITICO SMD
pins: 1 PLUS, 2 MINUS

## Capacitor SMD
designator C?  Valor: 100nF  Encapsulamento: SMD (1206)  (hidden comment: *)
Capacitor SMD; Descrição: Capacitor SMD; Marca: *; Modelo: *; Observação: *
footprint CAP_0603
footprint CAP_0805
footprint CAP_1206
footprint CAP_0402 (Chip Capacitor, Body 1.0x0.5mm, IPC High Density)
pins: 1, 2

## CAPACITOR TANTALO
designator C?  Valor: 100uF x 6.3V  (hidden comment: CAPACITOR TANTALO)
CAPACITOR TANTALO Case B; Descrição: Capacitor de Tantalo; Encapsulamento: SMD Case B; Marca: *; Modelo: *; Observação: *
footprint CASE B (Capacitor Tantalum; Body 3.5 x 2.8 mm)
pins: 1, 2

## Chave Tact
designator SW?  (value not drawn)
Chave Tact; Descrição: Chave Tact 6x6x5mm; Encapsulamento: PTH; Marca: *; Modelo: *; Observação: *
footprint Chave TACT
pins: 1, 2, 3, 4

## CHAVE TACT COM LED_1
designator B?  (value not drawn)
CHAVE TACT COM LED; Descrição: Chave TACT 6x6x7mm com LED; Encapsulamento: PTH; Marca: *; Modelo: *; Observação: *
footprint CHAVE TACT SMD COM LED2
pins: 1, 2, 3, 4, 5, 6

## CRISTAL-SMD-HC49S
designator XTAL?  Valor: 16MHz  (hidden comment: CRISTAL-SMD-HC49S)
Descrição: Cristal Oscilador; Encapsulamento: SMD HC49S; Marca: *; Modelo: *; Observação: *
footprint Cristal HC49S
pins: 1 OSC1, 2 OSC2

## Indutor_700mA
designator L?  Valor: 100uH x 700mA  (hidden comment: Indutor_700mA)
IND200-CIRC; Descrição: Indutor Carretel PTH; Encapsulamento: PTH - Radial; Marca: *; Modelo: *; Observação: *
footprint INDUTOR RADIAL 10.5MM
footprint INDUTOR RADIAL 11.3MM
pins: 1, 2

## Rele NA/NF
designator RL?, comment Rele
Descrição: Rele Ultraminiatura reversivel; Encapsulamento: PTH; Marca: Metatex; Modelo: MA1RC2; Valor: *; Observação: *
footprint Rele MA1RC2 - Metaltex
pins: 1 COM, 2 T1, 3 T2, 4 NO, 5 NC

## Resistor Array
designator R?  Valor: 1K  Encapsulamento: PTH - 7 vias  (hidden comment: *)
Matriz de Resistor; Descrição: Matriz de Resistor; Marca: *; Modelo: *; Observação: *
footprint RESISTOR-ARRAY-8pins
pins: 1, 2, 3, 4, 5, 6, 7, 8

## Resistor SMD
designator R?  Valor: 1K  Encapsulamento: SMD (0805)  (hidden comment: *)
Resistor SMD; Descrição: Resistor SMD 5%; Marca: *; Modelo: *; Observação: *
footprint RES_0603
footprint RES_0805
footprint RES_1206
footprint RES_2512
footprint RES_0402 (Chip Resistor, Body 1.0x0.5mm, IPC High Density)
footprint RES_2010
pins: 1, 2